# Altium footprint library common.PcbLib: 30 footprints (part 2 of 2)
Each footprint in its own frame and in the unit in brackets; x right, y up, seen from the top. Pads: shape width x height; smd on the part's side, far side on the other; paste and mask are expansions set on the pad; w line width, h text height; cw(c..) or ccw(c..) is an arc to the next point about the centre after c.
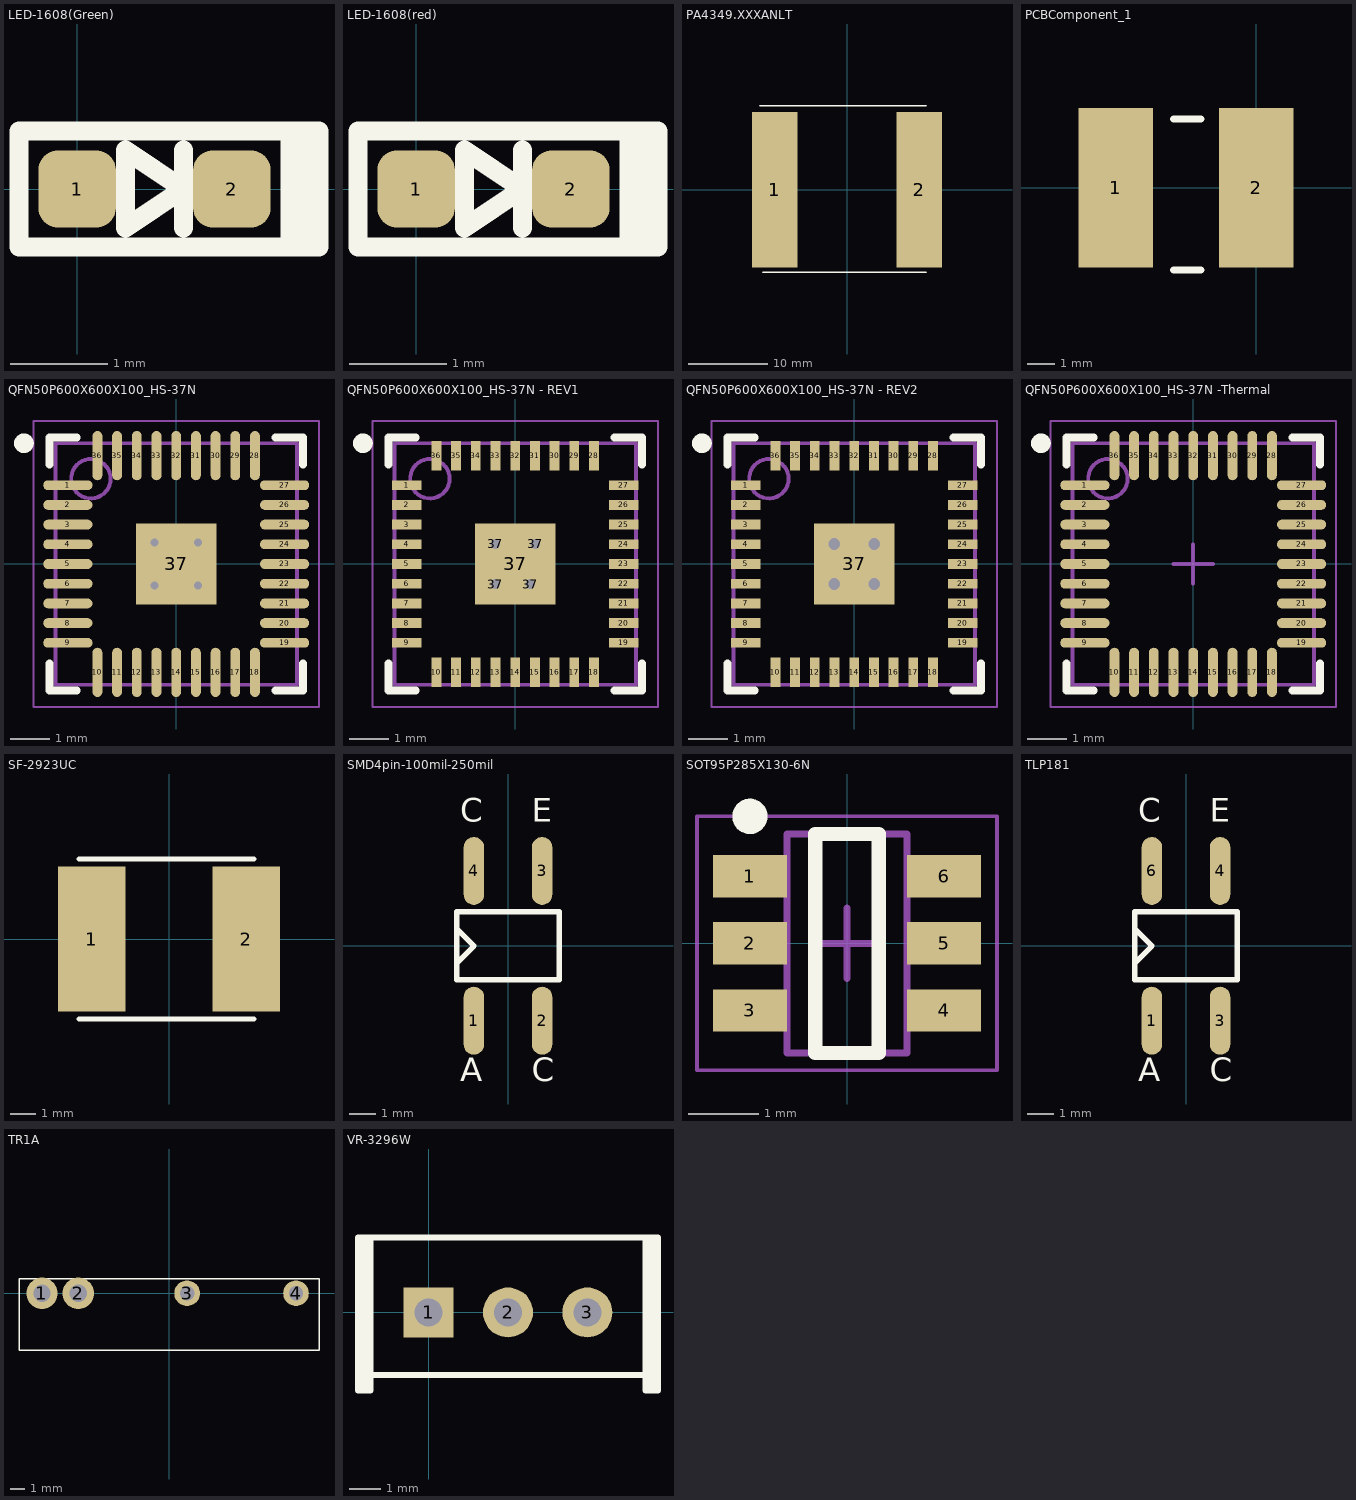
[diagram p1: the footprints below, top view; thin cyan lines are the x and y axes]

## LED-1608(Green) [mm]
pads (2):
  rrect50% 0.8x0.8 smd: 1(0,0) 2(1.6,0)
Top Overlay:
  lines w0.2: 1.1,-0.4 1.1,0.4 ; 2.2,-0.6 2.2,0.6 ; 2.3,-0.6 2.3,0.6 ; 2.4,-0.6 2.4,0.6 ; -0.6,-0.6 2.5,-0.6 2.5,0.6 -0.6,0.6 -0.6,-0.6 ; 0.5,-0.4 0.5,0.4 1.1,0 0.5,-0.4
3D body "LED-1608(Green).STEP": height 0.78, standoff -0.02, extent 0,-0.4 1.6,0.4

## LED-1608(red) [mm]
pads (2):
  rrect50% 0.8x0.8 smd: 1(0,0) 2(1.6,0)
Top Overlay:
  lines w0.2: 1.1,-0.4 1.1,0.4 ; 2.2,-0.6 2.2,0.6 ; 2.3,-0.6 2.3,0.6 ; 2.4,-0.6 2.4,0.6 ; -0.6,-0.6 2.5,-0.6 2.5,0.6 -0.6,0.6 -0.6,-0.6 ; 0.5,-0.4 0.5,0.4 1.1,0 0.5,-0.4
3D body "LED-1608(Red).STEP": height 0.78, standoff -0.02, extent 0,-0.4 1.6,0.4

## PA4349.XXXANLT [mm] "PA4349.XXXANLT Bourns Inductor"
pads (2):
  rect 5.75x19.6 smd: 1(-9.125,0) 2(9.125,0)
Top Overlay:
  lines w0.2: -11,10.6 10,10.6 ; -10.6,-10.4 10,-10.4
3D body: height 12.6, standoff 0, extent -11,-10.2 11,10

## PCBComponent_1 [mm]
pads (2):
  rrect1% 2.7x5.8 smd: 1(-5.1,0) 2(0,0)
Top Overlay:
  lines w0.254: -3,-3 -2,-3 ; -3,2.5 -2,2.5

## QFN50P600X600X100_HS-37N [mm] "QFN, 36-Leads, Body 6.00x6.00mm, Pitch 0.50mm, Thermal Pad 2.05x2.05mm, IPC Medium Density"
height 1
pads (37):
  oval 1.25x0.25 smd: 1(-2.75,2) 2(-2.75,1.5) 3(-2.75,1) 4(-2.75,0.5) 5(-2.75,0) 6(-2.75,-0.5) 7(-2.75,-1) 8(-2.75,-1.5) 9(-2.75,-2) 19(2.75,-2) 20(2.75,-1.5) 21(2.75,-1) 22(2.75,-0.5) 23(2.75,0) 24(2.75,0.5) 25(2.75,1) 26(2.75,1.5) 27(2.75,2)
  oval 0.25x1.25 smd: 10(-2,-2.75) 11(-1.5,-2.75) 12(-1,-2.75) 13(-0.5,-2.75) 14(0,-2.75) 15(0.5,-2.75) 16(1,-2.75) 17(1.5,-2.75) 18(2,-2.75) 28(2,2.75) 29(1.5,2.75) 30(1,2.75) 31(0.5,2.75) 32(0,2.75) 33(-0.5,2.75) 34(-1,2.75) 35(-1.5,2.75) 36(-2,2.75)
  rect 2.05x2.05 smd: 37(0,0)
via -0.55,0.55 diameter 0.5 hole 0.2
via 0.55,0.55 diameter 0.5 hole 0.2
via -0.55,-0.55 diameter 0.5 hole 0.2
via 0.55,-0.55 diameter 0.5 hole 0.2
Top Overlay:
  circle w0.25: c-3.865,3.065 r0.125
  lines w0.2: -3.215,-2.525 -3.215,-3.215 -2.525,-3.215 ; -3.215,2.525 -3.215,3.215 -2.525,3.215 ; 2.525,-3.215 3.215,-3.215 3.215,-2.525 ; 2.525,3.215 3.215,3.215 3.215,2.525
Mechanical 13:
  circle w0.1: c-2.165,2.165 r0.5
  lines w0.1: -3.065,-3.065 -3.065,3.065 3.065,3.065 3.065,-3.065 -3.065,-3.065
Mechanical 15:
  lines w0.05: -3.625,-3.625 -3.625,3.625 3.625,3.625 3.625,-3.625 -3.625,-3.625
  lines w0.1: -0.5,0 0.5,0 ; 0,-0.5 0,0.5
3D body "QFN50P600X600X100_HS-37N.step": height 1, standoff 0, extent -3.085,-3.085 3.085,3.085

## QFN50P600X600X100_HS-37N - REV1 [mm] "QFN, 36-Leads, Body 6.00x6.00mm, Pitch 0.50mm, Thermal Pad 2.05x2.05mm, IPC Medium Density"
height 1
pads (41):
  rect 0.75x0.25 smd: 1(-2.75,2) 2(-2.75,1.5) 3(-2.75,1) 4(-2.75,0.5) 5(-2.75,0) 6(-2.75,-0.5) 7(-2.75,-1) 8(-2.75,-1.5) 9(-2.75,-2) 19(2.75,-2) 20(2.75,-1.5) 21(2.75,-1) 22(2.75,-0.5) 23(2.75,0) 24(2.75,0.5) 25(2.75,1) 26(2.75,1.5) 27(2.75,2)
  rect 0.25x0.75 smd: 10(-2,-2.75) 11(-1.5,-2.75) 12(-1,-2.75) 13(-0.5,-2.75) 14(0,-2.75) 15(0.5,-2.75) 16(1,-2.75) 17(1.5,-2.75) 18(2,-2.75) 28(2,2.75) 29(1.5,2.75) 30(1,2.75) 31(0.5,2.75) 32(0,2.75) 33(-0.5,2.75) 34(-1,2.75) 35(-1.5,2.75) 36(-2,2.75)
  round 0.5 hole 0.25: 37(-0.508,-0.508) 37(-0.508,0.508) 37(0.381,-0.508) 37(0.508,0.508)
  rect 2.05x2.05 smd: 37(0,0)
Top Overlay:
  circle w0.25: c-3.865,3.065 r0.125
  lines w0.2: -3.215,-2.525 -3.215,-3.215 -2.525,-3.215 ; -3.215,2.525 -3.215,3.215 -2.525,3.215 ; 2.525,-3.215 3.215,-3.215 3.215,-2.525 ; 2.525,3.215 3.215,3.215 3.215,2.525
Mechanical 13:
  circle w0.1: c-2.165,2.165 r0.5
  lines w0.1: -3.065,-3.065 -3.065,3.065 3.065,3.065 3.065,-3.065 -3.065,-3.065
Mechanical 15:
  lines w0.05: -3.625,-3.625 -3.625,3.625 3.625,3.625 3.625,-3.625 -3.625,-3.625
  lines w0.1: -0.5,0 0.5,0 ; 0,-0.5 0,0.5
3D body "QFN50P600X600X100_HS-37N.step": height 1, standoff 0, extent -3.085,-3.085 3.085,3.085

## QFN50P600X600X100_HS-37N - REV2 [mm] "QFN, 36-Leads, Body 6.00x6.00mm, Pitch 0.50mm, Thermal Pad 2.05x2.05mm, IPC Medium Density"
height 1
pads (37):
  rect 0.75x0.25 smd: 1(-2.75,2) 2(-2.75,1.5) 3(-2.75,1) 4(-2.75,0.5) 5(-2.75,0) 6(-2.75,-0.5) 7(-2.75,-1) 8(-2.75,-1.5) 9(-2.75,-2) 19(2.75,-2) 20(2.75,-1.5) 21(2.75,-1) 22(2.75,-0.5) 23(2.75,0) 24(2.75,0.5) 25(2.75,1) 26(2.75,1.5) 27(2.75,2)
  rect 0.25x0.75 smd: 10(-2,-2.75) 11(-1.5,-2.75) 12(-1,-2.75) 13(-0.5,-2.75) 14(0,-2.75) 15(0.5,-2.75) 16(1,-2.75) 17(1.5,-2.75) 18(2,-2.75) 28(2,2.75) 29(1.5,2.75) 30(1,2.75) 31(0.5,2.75) 32(0,2.75) 33(-0.5,2.75) 34(-1,2.75) 35(-1.5,2.75) 36(-2,2.75)
  rect 2.05x2.05 smd: 37(0,0)
via 0.508,-0.508 diameter 0.5 hole 0.3
via -0.508,-0.508 diameter 0.5 hole 0.3
via 0.508,0.508 diameter 0.5 hole 0.3
via -0.508,0.508 diameter 0.5 hole 0.3
Top Overlay:
  circle w0.25: c-3.865,3.065 r0.125
  lines w0.2: -3.215,-2.525 -3.215,-3.215 -2.525,-3.215 ; -3.215,2.525 -3.215,3.215 -2.525,3.215 ; 2.525,-3.215 3.215,-3.215 3.215,-2.525 ; 2.525,3.215 3.215,3.215 3.215,2.525
Mechanical 13:
  circle w0.1: c-2.165,2.165 r0.5
  lines w0.1: -3.065,-3.065 -3.065,3.065 3.065,3.065 3.065,-3.065 -3.065,-3.065
Mechanical 15:
  lines w0.05: -3.625,-3.625 -3.625,3.625 3.625,3.625 3.625,-3.625 -3.625,-3.625
  lines w0.1: -0.5,0 0.5,0 ; 0,-0.5 0,0.5
3D body "QFN50P600X600X100_HS-37N.step": height 1, standoff 0, extent -3.085,-3.085 3.085,3.085

## QFN50P600X600X100_HS-37N -Thermal [mm] "QFN, 36-Leads, Body 6.00x6.00mm, Pitch 0.50mm, Thermal Pad 2.05x2.05mm, IPC Medium Density"
height 1
pads (36):
  oval 1.25x0.25 smd: 1(-2.75,2) 2(-2.75,1.5) 3(-2.75,1) 4(-2.75,0.5) 5(-2.75,0) 6(-2.75,-0.5) 7(-2.75,-1) 8(-2.75,-1.5) 9(-2.75,-2) 19(2.75,-2) 20(2.75,-1.5) 21(2.75,-1) 22(2.75,-0.5) 23(2.75,0) 24(2.75,0.5) 25(2.75,1) 26(2.75,1.5) 27(2.75,2)
  oval 0.25x1.25 smd: 10(-2,-2.75) 11(-1.5,-2.75) 12(-1,-2.75) 13(-0.5,-2.75) 14(0,-2.75) 15(0.5,-2.75) 16(1,-2.75) 17(1.5,-2.75) 18(2,-2.75) 28(2,2.75) 29(1.5,2.75) 30(1,2.75) 31(0.5,2.75) 32(0,2.75) 33(-0.5,2.75) 34(-1,2.75) 35(-1.5,2.75) 36(-2,2.75)
Top Overlay:
  circle w0.25: c-3.865,3.065 r0.125
  lines w0.2: -3.215,-2.525 -3.215,-3.215 -2.525,-3.215 ; -3.215,2.525 -3.215,3.215 -2.525,3.215 ; 2.525,-3.215 3.215,-3.215 3.215,-2.525 ; 2.525,3.215 3.215,3.215 3.215,2.525
Mechanical 13:
  circle w0.1: c-2.165,2.165 r0.5
  lines w0.1: -3.065,-3.065 3.065,-3.065 3.065,3.065 -3.065,3.065 -3.065,-3.065
Mechanical 15:
  lines w0.05: -3.625,-3.625 3.625,-3.625 3.625,3.625 -3.625,3.625 -3.625,-3.625
  lines w0.1: -0.5,0 0.5,0 ; 0,-0.5 0,0.5
3D body "QFN50P600X600X100_HS-37N.step": height 1, standoff 0, extent -3.085,-3.085 3.085,3.085

## SF-2923UC [mm] "SF-2923UC 5.8x7.3mm Fuse"
pads (2):
  rect 2.7x5.8 smd: 1(-3.1,0) 2(3.1,0)
Top Overlay:
  lines w0.2: -3.6,-3.2 3.4,-3.2 ; -3.6,3.2 3.4,3.2
3D body "SF-2923UC-C.stp": height 4, standoff 0, extent -3.65,-2.9 3.65,2.9

## SMD4pin-100mil-250mil [mm]
height 0.064
pads (4):
  oval 0.762x2.532 smd: 1(-1.27,-2.79) 2(1.27,-2.79) 3(1.27,2.79) 4(-1.27,2.79)
Top Overlay:
  lines w0.203: -1.905,-0.635 -1.27,0 -1.905,0.635 ; -1.905,-1.27 1.905,-1.27 1.905,1.27 -1.905,1.27 -1.905,-1.27
  text "A" at -1.778,-5.334 h1.52
  text "C" at 0.889,-5.334 h1.52
  text "E" at 0.889,4.318 h1.52
  text "C" at -1.778,4.318 h1.52
3D body "TLP-181-Yale.STEP": height 2.3, standoff 0, extent -1.8,-3.5 1.8,3.5

## SOT95P285X130-6N [mm] "SOT23, 6-Leads, Body 3.00x2.85mm, Pitch 0.95mm, IPC Medium Density"
height 1.3
pads (6):
  rect 1.05x0.6 smd: 1(-1.375,0.95) 2(-1.375,0) 3(-1.375,-0.95) 4(1.375,-0.95) 5(1.375,0) 6(1.375,0.95)
Top Overlay:
  circle w0.25: c-1.375,1.8 r0.125
  lines w0.2: -0.45,-1.55 0.45,-1.55 0.45,1.55 -0.45,1.55 -0.45,-1.55
Mechanical 13:
  lines w0.1: -0.85,-1.55 -0.85,1.55 0.85,1.55 0.85,-1.55 -0.85,-1.55
Mechanical 15:
  lines w0.05: -2.125,-1.8 -2.125,1.8 2.125,1.8 2.125,-1.8 -2.125,-1.8
  lines w0.1: -0.5,0 0.5,0 ; 0,-0.5 0,0.5
3D body "SOT95P285X130-6N.step": height 1.3, standoff 0, extent -1.5,-1.55 1.5,1.55

## TLP181 [mm]
height 0.064
pads (4):
  oval 0.762x2.532 smd: 1(-1.27,-2.79) 3(1.27,-2.79) 4(1.27,2.79) 6(-1.27,2.79)
Top Overlay:
  lines w0.203: -1.905,-0.635 -1.27,0 -1.905,0.635 ; -1.905,-1.27 -1.905,1.27 1.905,1.27 1.905,-1.27 -1.905,-1.27
  text "C" at -1.778,4.318 h1.52
  text "E" at 0.889,4.318 h1.52
  text "C" at 0.889,-5.334 h1.52
  text "A" at -1.778,-5.334 h1.52
3D body "TLP-181-Yale.STEP": height 2.3, standoff 0, extent -1.8,-3.5 1.8,3.5

## TR1A [mm]
height 5.96
pads (4):
  round 2.2 hole 1.2: 1(-8.89,0) 2(-6.35,0)
  round 1.8 hole 1: 3(1.27,0) 4(8.89,0)
Top Overlay:
  lines w0.1: -10.5,-4 10.5,-4 10.5,1 5.25,1 -5.25,1 -10.5,1 -10.5,-4
3D body "TA-1a.stp": height 12.25, standoff -3.75, extent -10.86,-4.1 10.14,0.9

## VR-3296W [mm]
height 11.5
pads (3):
  rect 1.6x1.6 hole 0.9: 1(0,0)
  round 1.6 hole 0.9: 2(2.54,0) 3(5.08,0)
Top Overlay:
  lines w0.2: -2.06,-2.5 -2.06,2.4 ; -1.86,2.4 -1.86,-2.5 -2.26,-2.5 -2.26,-2 ; 6.94,2.4 6.94,-2 6.94,-2.5 7.34,-2.5 7.34,-2 ; 7.14,-2.5 7.14,2.4 ; -2.26,-2 -2.26,2.4 7.34,2.4 7.34,-2 ; -2.26,-2 7.34,-2
3D body "VR-3296W-Yale.STEP": height 11.55, standoff -2.53, extent -2.225,-2.41 7.305,2.41